# Altium footprint library RDM_ALT_PCB.PcbLib: 171 footprints (part 2 of 11)
Each footprint in its own frame and in the unit in brackets; x right, y up, seen from the top. Pads: shape width x height; smd on the part's side, far side on the other; paste and mask are expansions set on the pad; w line width, h text height; cw(c..) or ccw(c..) is an arc to the next point about the centre after c.
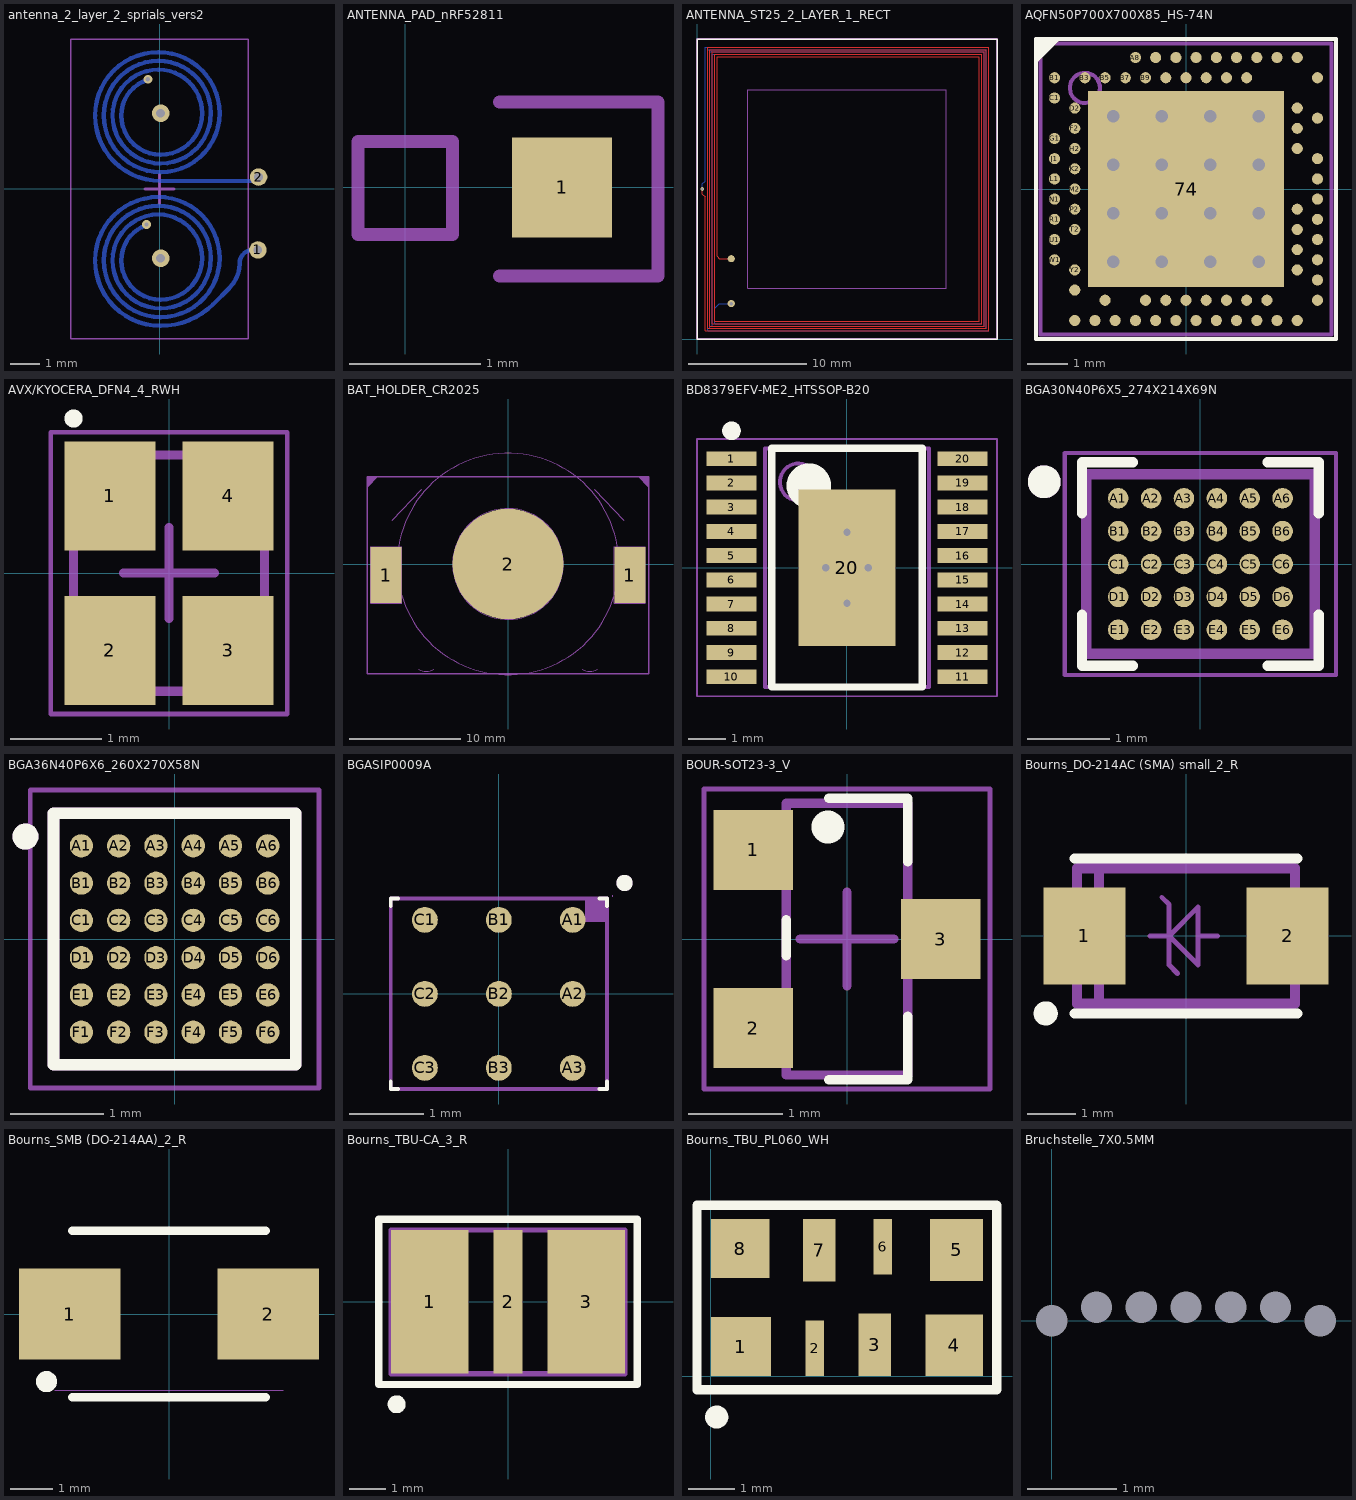
[diagram p1: the footprints below, top view; thin cyan lines are the x and y axes]

## antenna_2_layer_2_sprials_vers2 [mm] "antenna 2 layer"
pads (2):
  round 0.6 hole 0.3: 1(3.377,-2.093) 2(3.402,0.411)
via -0.399,3.772 diameter 0.3 hole 0.15
via -0.445,-1.22 diameter 0.3 hole 0.15
via 0.037,-2.376 diameter 0.6 hole 0.3
via 0.037,2.601 diameter 0.6 hole 0.3
Mid-Layer 1:
  lines w0.15: 0.037,-2.376 0.037,2.601
Mid-Layer 2:
  lines w0.15: -0.436,-1.244 cw(c-0.038,-2.376) 1.162,-2.376 cw(c0.037,-2.376) 0.037,-3.501 cw(c0.037,-2.451) -1.012,-2.451 cw(c-0.038,-2.451) -0.038,-1.476 cw(c-0.038,-2.376) 0.862,-2.376 cw(c0.037,-2.376) 0.037,-3.201 cw(c0.037,-2.451) -0.713,-2.451 cw(c-0.038,-2.451) -0.038,-1.776 cw(c-0.038,-2.376) 0.562,-2.376 cw(c0.037,-2.376) 0.037,-2.901 cw(c0.037,-2.638) 0.037,-2.376 ; -0.392,3.747 cw(c-0.038,2.601) 1.162,2.601 cw(c0.037,2.601) 0.037,1.476 cw(c0.037,2.526) -1.012,2.526 cw(c-0.038,2.526) -0.038,3.501 cw(c-0.038,2.601) 0.862,2.601 cw(c0.037,2.601) 0.037,1.776 cw(c0.037,2.526) -0.713,2.526 cw(c-0.038,2.526) -0.038,3.201 cw(c-0.038,2.601) 0.562,2.601 cw(c0.037,2.601) 0.037,2.076 cw(c0.037,2.338) 0.037,2.601
Bottom Layer:
  lines w0.15: -0.438,-1.24 ccw(c-0.038,-2.451) -1.313,-2.451 ccw(c0.037,-2.451) 0.037,-3.801 ccw(c0.037,-2.376) 1.462,-2.376 ccw(c-0.038,-2.376) -0.038,-0.876 ccw(c-0.038,-2.451) -1.613,-2.451 ccw(c0.037,-2.451) 0.037,-4.101 ccw(c0.037,-2.376) 1.762,-2.376 ccw(c-0.038,-2.376) -0.038,-0.576 ccw(c-0.038,-2.451) -1.913,-2.451 ccw(c0.037,-2.451) 0.037,-4.401 ccw(c0.037,-2.376) 2.062,-2.376 ccw(c-0.038,-2.376) -0.038,-0.276 ccw(c-0.038,-2.451) -2.212,-2.451 ccw(c0.037,-2.451) 0.037,-4.701 ccw(c0.037,-2.137) 1.85,-3.95 2.396,-3.404 ccw(c1.543,-2.55) 2.75,-2.55 cw(c3.207,-2.55) 3.101,-2.105 ; -0.393,3.75 ccw(c-0.038,2.526) -1.313,2.526 ccw(c0.037,2.526) 0.037,1.176 ccw(c0.037,2.601) 1.462,2.601 ccw(c-0.038,2.601) -0.038,4.101 ccw(c-0.038,2.526) -1.613,2.526 ccw(c0.037,2.526) 0.037,0.876 ccw(c0.037,2.601) 1.762,2.601 ccw(c-0.038,2.601) -0.038,4.401 ccw(c-0.038,2.526) -1.913,2.526 ccw(c0.037,2.526) 0.037,0.576 ccw(c0.037,2.601) 2.062,2.601 ccw(c-0.038,2.601) -0.038,4.701 ccw(c-0.038,2.526) -2.212,2.526 ccw(c0.037,2.526) 0.037,0.276 3.2,0.276
Mechanical 15:
  lines w0.013: -0.188,2.601 0.037,2.601
  lines w0.05: -3.05,-5.15 -3.05,5.15 3.05,5.15 3.05,-5.15 -3.05,-5.15
  lines w0.1: -0.5,0 0.5,0 ; 0,-0.5 0,0.5
3D body: height 0.25, standoff 0, extent 3.742,1.578 3.742,1.578

## ANTENNA_PAD_nRF52811 [mil] "open end one wire antenna for 2.4GHz"
pads (1):
  rect 30x30 smd: 1(47.05,0)
Mechanical 15:
  lines w3.94: 28.35,-26.57 75.79,-26.57 75.79,25.59 28.35,25.59 ; -14.17,-14.17 14.17,-14.17 14.17,13.78 -14.17,13.78 -14.17,-14.17

## ANTENNA_ST25_2_LAYER_1_RECT [mm] "3,56 MHZ NFC Antenna for Nordic ST25DV04K"
pads (2):
  round 0.6 smd: 1(2.9,6.8) 2(2.9,3)
via 2.9,3 diameter 0.6 hole 0.3
via 0.457,12.7 diameter 0.3 hole 0.2
Top Layer:
  lines w0.1: 0.457,12.7 0.457,12.268 0.698,12.027 0.698,0.7 24.7,0.7 24.7,24.7 0.9,24.7 0.9,0.9 24.5,0.9 24.5,24.5 1.1,24.5 1.1,1.1 24.3,1.1 24.3,24.3 1.3,24.3 1.3,1.3 24.1,1.3 24.1,24.1 1.5,24.1 1.5,1.5 23.9,1.5 23.9,23.9 1.7,23.9 1.7,7 1.9,6.8 2.9,6.8
Bottom Layer:
  lines w0.1: 0.457,12.7 0.457,13.132 0.7,13.375 0.702,24.7 24.7,24.7 24.7,0.7 0.9,0.7 0.9,24.5 24.5,24.5 24.5,0.9 1.1,0.9 1.1,24.3 24.3,24.3 24.3,1.1 1.3,1.1 1.3,24.1 24.1,24.1 24.1,1.3 1.5,1.3 1.5,2.6 1.9,3 2.9,3
Top Overlay:
  lines w0.127: 0,0 0,25.4 25.4,25.4 25.4,0 0,0
Mechanical 15:
  lines w0.1: 0,0 25.4,0 ; 4.3,4.3 4.3,21.1 21.1,21.1 21.1,4.3 4.3,4.3
  lines w0.15: 0,0 0,25.4 25.4,25.4 25.4,0 0,0

## AQFN50P700X700X85_HS-74N [mm] "nRF52840"
pads (74):
  rect 4.85x4.85 smd mask+0.05: 74(0,0)
  round 0.275 smd paste+0.012 mask+0.05: A8(-1.25,3.25) A10(-0.75,3.25) A12(-0.25,3.25) A14(0.25,3.25) A16(0.75,3.25) A18(1.25,3.25) A20(1.75,3.25) A22(2.25,3.25) A23(2.75,3.25) AA24(3.25,-2.25) AB2(-2.75,-2.5) AC5(-2,-2.75) AC9(-1,-2.75) AC11(-0.5,-2.75) AC13(0,-2.75) AC15(0.5,-2.75) AC17(1,-2.75) AC19(1.5,-2.75) AC21(2,-2.75) AC24(3.25,-2.75) AD2(-2.75,-3.25) AD4(-2.25,-3.25) AD6(-1.75,-3.25) AD8(-1.25,-3.25) AD10(-0.75,-3.25) AD12(-0.25,-3.25) AD14(0.25,-3.25) AD16(0.75,-3.25) AD18(1.25,-3.25) AD20(1.75,-3.25) AD22(2.25,-3.25) AD23(2.75,-3.25) B1(-3.25,2.75) B3(-2.5,2.75) B5(-2,2.75) B7(-1.5,2.75) B9(-1,2.75) B11(-0.5,2.75) B13(0,2.75) B15(0.5,2.75) B17(1,2.75) B19(1.5,2.75) B24(3.25,2.75) C1(-3.25,2.25) D2(-2.75,2) D23(2.75,2) E24(3.25,1.75) F2(-2.75,1.5) F23(2.75,1.5) G1(-3.25,1.25) H2(-2.75,1) H23(2.75,1) J1(-3.25,0.75) J24(3.25,0.75) K2(-2.75,0.5) L1(-3.25,0.25) L24(3.25,0.25) M2(-2.75,0) N1(-3.25,-0.25) N24(3.25,-0.25) P2(-2.75,-0.5) P23(2.75,-0.5) R1(-3.25,-0.75) R24(3.25,-0.75) T2(-2.75,-1) T23(2.75,-1) U1(-3.25,-1.25) U24(3.25,-1.25) V23(2.75,-1.5) W1(-3.25,-1.75) W24(3.25,-1.75) Y2(-2.75,-2) Y23(2.75,-2)
via 1.8,-1.8 diameter 0.61 hole 0.305
via 0.6,-1.8 diameter 0.61 hole 0.305
via -0.6,-1.8 diameter 0.61 hole 0.305
via -1.8,-1.8 diameter 0.61 hole 0.305
via 1.8,-0.6 diameter 0.61 hole 0.305
via 0.6,-0.6 diameter 0.61 hole 0.305
via -0.6,-0.6 diameter 0.61 hole 0.305
via -1.8,-0.6 diameter 0.61 hole 0.305
via 1.8,0.6 diameter 0.61 hole 0.305
via 0.6,0.6 diameter 0.61 hole 0.305
via -0.6,0.6 diameter 0.61 hole 0.305
via -1.8,0.6 diameter 0.61 hole 0.305
via 1.8,1.8 diameter 0.61 hole 0.305
via 0.6,1.8 diameter 0.61 hole 0.305
via -0.6,1.8 diameter 0.61 hole 0.305
via -1.8,1.8 diameter 0.61 hole 0.305
Top Overlay:
  region: -3.154,3.654 -3.654,3.154 -3.654,3.654
  lines w0.1: -3.708,-3.708 3.708,-3.708 3.708,3.708 -3.708,3.708 -3.708,-3.708
Mechanical 13:
  region: -3.154,3.654 -3.654,3.154 -3.654,3.654
  lines w0.05: -0.3,0 0.3,0 ; 0,-0.3 0,0.3
  lines w0.1: -3.6,-3.6 -3.6,3.6 3.6,3.6 3.6,-3.6 -3.6,-3.6
Mechanical 15:
  circle w0.1: c-2.5,2.5 r0.373
  region: -3.154,3.654 -3.654,3.154 -3.654,3.654
  lines w0.05: -0.3,0 0.3,0 ; 0,-0.3 0,0.3
  lines w0.1: -3.708,-3.708 -3.708,3.708 3.708,3.708 3.708,-3.708 -3.708,-3.708
  text ".Designator" at -0.178,-0.152 h0.3
3D body "LGA88C25P25X25_700X700X85.step": height 0.85, standoff 0, extent -3.55,-3.55 3.55,3.55

## AVX/KYOCERA_DFN4_4_RWH [mm]
pads (4):
  rect 1x1.2 smd: 1(-0.65,0.85) 2(-0.65,-0.85) 3(0.65,-0.85) 4(0.65,0.85)
Top Overlay:
  circle w0.1: c-1.05,1.7 r0.05
Mechanical 13:
  lines w0.1: -1.05,-1.3 1.05,-1.3 1.05,1.3 -1.05,1.3 -1.05,-1.3
Mechanical 15:
  lines w0.05: -1.3,-1.55 1.3,-1.55 1.3,1.55 -1.3,1.55 -1.3,-1.55
  lines w0.1: -0.5,0 0.5,0 ; 0,-0.5 0,0.5
3D body "DFN130P200X55-4N.step": height 0.55, standoff 0, extent -1.05,-1.45 1.5,1.45

## BAT_HOLDER_CR2025 [mm] "BATTERY RETAINER COIN 20MM SMD"
pads (3):
  rect 2.79x5.08 smd: 1(-11,-1) 1(11,-1)
  round 10 smd: 2(0,0)
Mechanical 29 (Mech29):
  circle w0.1: c0,0 r5.004
  circle w0.1: c0,0 r10
  region: -12.7,7.25
  region: -12.7,6.9 -11.7,7.9 -12.7,7.9
  region: 11.7,7.9 12.7,6.9 12.7,7.9
  lines w0.1: -12.395,-3.53 -12.383,-3.542 -9.615,-3.542 -9.604,-3.531 -9.604,1.544 -9.609,1.539 -12.395,1.539 -12.395,-3.529 ; -10.439,3.937 -7.798,6.731 ; -8.049,-9.496 ccw(c-7.38,-8.497) -6.709,-9.494 ; -1.06,-1.063 1.06,1.059 ; -1.06,1.058 1.061,-1.063 ; 6.711,-9.496 ccw(c7.38,-8.497) 8.051,-9.494 ; 7.798,6.756 10.465,3.937 ; 9.6,-3.524 9.612,-3.536 12.38,-3.536 12.391,-3.525 12.391,1.55 12.386,1.545 9.6,1.545 9.6,-3.523
  lines w0.127: -12.7,-9.89 -12.7,7.89 ; -12.7,-9.89 -12.7,7.89 ; -12.7,-9.89 12.7,-9.89 ; -12.7,-9.89 12.7,-9.89 ; -12.7,7.89 12.7,7.89 ; -12.7,7.89 12.7,7.89 ; 12.7,-9.89 12.7,7.89 ; 12.7,-9.89 12.7,7.89
3D body: height 2.45, standoff 0, extent -10,-10 10,10
3D body "User Library-keystone-PN3034.STEP": height 4.08, standoff 0.01, extent -11.621,-9.725 11.621,6.754

## BD8379EFV-ME2_HTSSOP-B20 [mm] "TSOP, 20-Leads, Body 6.40x4.40mm, Pitch 0.65mm, IPC Medium Density"
height 1.5
pads (21):
  rect 1.35x0.4 smd: 1(-3.1,2.925) 2(-3.1,2.275) 3(-3.1,1.625) 4(-3.1,0.975) 5(-3.1,0.325) 6(-3.1,-0.325) 7(-3.1,-0.975) 8(-3.1,-1.625) 9(-3.1,-2.275) 10(-3.1,-2.925) 11(3.1,-2.925) 12(3.1,-2.275) 13(3.1,-1.625) 14(3.1,-0.975) 15(3.1,-0.325) 16(3.1,0.325) 17(3.1,0.975) 18(3.1,1.625) 19(3.1,2.275) 20(3.1,2.925)
  rect 2.6x4.2 smd: 20(0,0)
via 0.575,0 diameter 0.3 hole 0.2
via 0,0.95 diameter 0.3 hole 0.2
via 0,-0.95 diameter 0.3 hole 0.2
via -0.575,0 diameter 0.3 hole 0.2
Top Overlay:
  circle w0.6: c-1.025,2.2 r0.3
  circle w0.25: c-3.1,3.675 r0.125
  lines w0.2: -2.025,-3.2 2.025,-3.2 2.025,3.2 -2.025,3.2 -2.025,-3.2
Mechanical 13:
  circle w0.1: c-1.3,2.3 r0.5
  lines w0.1: -2.2,-3.2 2.2,-3.2 2.2,3.2 -2.2,3.2 -2.2,-3.2
Mechanical 15:
  lines w0.05: -4.025,-3.45 4.025,-3.45 4.025,3.45 -4.025,3.45 -4.025,-3.45
  lines w0.1: -0.5,0 0.5,0 ; 0,-0.5 0,0.5
3D body: height 1, standoff 0.1, extent -2.2,-3.2 2.2,3.2

## BGA30N40P6X5_274X214X69N [mm] "ST25R3912"
pads (30):
  round 0.25 smd: A1(-1,0.8) A2(-0.6,0.8) A3(-0.2,0.8) A4(0.2,0.8) A5(0.6,0.8) A6(1,0.8) B1(-1,0.4) B2(-0.6,0.4) B3(-0.2,0.4) B4(0.2,0.4) B5(0.6,0.4) B6(1,0.4) C1(-1,0) C2(-0.6,0) C3(-0.2,0) C4(0.2,0) C5(0.6,0) C6(1,0) D1(-1,-0.4) D2(-0.6,-0.4) D3(-0.2,-0.4) D4(0.2,-0.4) D5(0.6,-0.4) D6(1,-0.4) E1(-1,-0.8) E2(-0.6,-0.8) E3(-0.2,-0.8) E4(0.2,-0.8) E5(0.6,-0.8) E6(1,-0.8)
Top Overlay:
  circle w0.2: c-1.9,1 r0.1
  lines w0.127: -1.44,-0.62 -1.44,-1.24 -0.82,-1.24 ; -1.44,0.62 -1.44,1.24 -0.82,1.24 ; 0.82,-1.24 1.44,-1.24 1.44,-0.62 ; 0.82,1.24 1.44,1.24 1.44,0.62
Mechanical 4:
  circle w0.2: c-1.9,1 r0.1
  circle w0.2: c-1.9,1 r0.1
  lines w0.127: -1.39,-1.09 1.39,-1.09 ; -1.39,-1.09 -1.39,1.09 ; -1.39,-1.09 1.39,-1.09 ; -1.39,-1.09 -1.39,1.09 ; -1.39,1.09 1.39,1.09 ; -1.39,1.09 1.39,1.09 ; 1.39,-1.09 1.39,1.09 ; 1.39,-1.09 1.39,1.09
Mechanical 16:
  lines w0.05: -1.65,-1.35 1.65,-1.35 1.65,1.35 -1.65,1.35 -1.65,-1.35

## BGA36N40P6X6_260X270X58N [mm] "MCU 32-Bit STM32 ARM Cortex M4 RISC 128KB Flash 2.5V/3.3V 36-Pin WLCSP"
pads (36):
  round 0.25 smd: A1(-1,1) A2(-0.6,1) A3(-0.2,1) A4(0.2,1) A5(0.6,1) A6(1,1) B1(-1,0.6) B2(-0.6,0.6) B3(-0.2,0.6) B4(0.2,0.6) B5(0.6,0.6) B6(1,0.6) C1(-1,0.2) C2(-0.6,0.2) C3(-0.2,0.2) C4(0.2,0.2) C5(0.6,0.2) C6(1,0.2) D1(-1,-0.2) D2(-0.6,-0.2) D3(-0.2,-0.2) D4(0.2,-0.2) D5(0.6,-0.2) D6(1,-0.2) E1(-1,-0.6) E2(-0.6,-0.6) E3(-0.2,-0.6) E4(0.2,-0.6) E5(0.6,-0.6) E6(1,-0.6) F1(-1,-1) F2(-0.6,-1) F3(-0.2,-1) F4(0.2,-1) F5(0.6,-1) F6(1,-1)
Top Overlay:
  circle w0.14: c-1.6,1.1 r0.07
  lines w0.127: -1.3,-1.35 1.3,-1.35 1.3,1.35 -1.3,1.35 -1.3,-1.35
Top Solder:
  circle w0: c-1,1 r0.175
  circle w0: c-0.6,1 r0.175
  circle w0: c-0.2,1 r0.175
  circle w0: c0.2,1 r0.175
  circle w0: c0.6,1 r0.175
  circle w0: c1,1 r0.175
  circle w0: c-1,0.6 r0.175
  circle w0: c-0.6,0.6 r0.175
  circle w0: c-0.2,0.6 r0.175
  circle w0: c0.2,0.6 r0.175
  circle w0: c0.6,0.6 r0.175
  circle w0: c1,0.6 r0.175
  circle w0: c-1,0.2 r0.175
  circle w0: c-0.6,0.2 r0.175
  circle w0: c-0.2,0.2 r0.175
  circle w0: c0.2,0.2 r0.175
  circle w0: c0.6,0.2 r0.175
  circle w0: c1,0.2 r0.175
  circle w0: c-1,-0.2 r0.175
  circle w0: c-0.6,-0.2 r0.175
  circle w0: c-0.2,-0.2 r0.175
  circle w0: c0.2,-0.2 r0.175
  circle w0: c0.6,-0.2 r0.175
  circle w0: c1,-0.2 r0.175
  circle w0: c-1,-0.6 r0.175
  circle w0: c-0.6,-0.6 r0.175
  circle w0: c-0.2,-0.6 r0.175
  circle w0: c0.2,-0.6 r0.175
  circle w0: c0.6,-0.6 r0.175
  circle w0: c1,-0.6 r0.175
  circle w0: c-1,-1 r0.175
  circle w0: c-0.6,-1 r0.175
  circle w0: c-0.2,-1 r0.175
  circle w0: c0.2,-1 r0.175
  circle w0: c0.6,-1 r0.175
  circle w0: c1,-1 r0.175
Mechanical 4:
  circle w0.14: c-1.6,1.1 r0.07
  circle w0.14: c-1.6,1.1 r0.07
  lines w0.127: -1.3,-1.35 -1.3,1.35 ; -1.3,-1.35 1.3,-1.35 ; -1.3,-1.35 -1.3,1.35 ; -1.3,-1.35 1.3,-1.35 ; -1.3,1.35 1.3,1.35 ; -1.3,1.35 1.3,1.35 ; 1.3,-1.35 1.3,1.35 ; 1.3,-1.35 1.3,1.35
Mechanical 16:
  lines w0.05: -1.55,-1.6 1.55,-1.6 1.55,1.6 -1.55,1.6 -1.55,-1.6
3D body "STM32F051T8Y6TR--3DModel-STEP-56544.STEP": height 0.42, standoff -0.16, extent -1.303,-1.402 1.302,1.301

## BGASIP0009A [mm] "9 Pin µSIP-Package (TPS81256)"
pads (9):
  round 0.35 smd: A1(0.999,1) A2(0.999,0) A3(0.999,-1) B1(-0.001,1) B2(0,0) B3(-0.001,-1) C1(-1.001,1) C2(-1.001,0) C3(-1.001,-1)
Top Overlay:
  circle w0.2: c1.7,1.5 r0.01
  lines w0.05: -1.462,-1.185 -1.462,-1.287 -1.361,-1.287 ; -1.462,1.187 -1.462,1.288 -1.361,1.288 ; 1.361,-1.287 1.462,-1.287 1.462,-1.185 ; 1.361,1.288 1.462,1.288 1.462,1.187
Mechanical 4:
  circle w0.001: c1.537,1.324 r0.005
Mechanical 13:
  circle w0.2: c1.7,1.5 r0.01
  region: 1.463,1.273 1.168,1.273 1.168,0.969 1.463,0.969
  lines w0.03: -0.15,0 0.15,0 ; 0,-0.15 0,0.15
  lines w0.05: -1.462,-1.287 -1.462,1.288 1.462,1.288 1.462,-1.287 -1.462,-1.287
Mechanical 15:
  circle w0.2: c1.7,1.5 r0.01
  region: 1.463,1.273 1.168,1.273 1.168,0.969 1.463,0.969
  lines w0.03: -0.15,0 0.15,0 -0.15,0 ; 0,-0.15 0,0.15 0,-0.15
  lines w0.05: -1.462,-1.287 1.462,-1.287 1.462,1.288 -1.462,1.288 -1.462,-1.287
Multi-Layer:
  pour cut-out: 0.351,2.77
3D body: height 1, standoff -0.01, extent -1.473,-1.295 1.473,1.295

## BOUR-SOT23-3_V [mm] "SOT23, 3-Leads, Body 2.9x1.3mm, Pitch 0.95mm"
height 1.17
pads (3):
  rect 0.85x0.85 smd: 1(-1,0.95) 2(-1,-0.95) 3(1,0)
Top Overlay:
  circle w0.25: c-0.203,1.194 r0.051
  lines w0.102: -0.65,-0.178 -0.65,0.203 ; -0.195,-1.5 0.65,-1.5 0.65,-0.825 ; -0.195,1.5 0.65,1.5 0.65,0.825
Mechanical 13:
  lines w0.1: -0.65,-1.45 -0.65,1.45 0.65,1.45 0.65,-1.45 -0.65,-1.45
Mechanical 15:
  lines w0.05: -1.525,-1.6 -1.525,1.6 1.525,1.6 1.525,-1.6 -1.525,-1.6
  lines w0.1: -0.5,0 0.5,0 ; 0,-0.5 0,0.5
3D body: height 1.17, standoff 0.02, extent -0.65,-1.45 0.65,1.45

## Bourns_DO-214AC (SMA) small_2_R [mm] "Bourns_DO-214AC (SMA) small_2_R"
height 2.6
pads (2):
  rect 1.7x2 smd: 1(-2.1,0) 2(2.1,0)
Top Overlay:
  circle w0.25: c-2.9,-1.6 r0.125
  lines w0.21: -2.3,-1.6 2.3,-1.6 ; -2.3,1.6 2.3,1.6
Mechanical 13:
  lines w0.21: -1.8,-1.4 -1.8,1.4 ; -2.25,-1.4 -2.25,1.4 2.25,1.4 2.25,-1.4 -2.25,-1.4
Mechanical 15:
  lines w0.1: -0.75,0 -0.35,0 ; -0.5,0.8 -0.35,0.65 -0.35,0.6 -0.35,-0.6 -0.175,-0.775 ; 0.25,0 0.65,0 ; -0.35,0 0.25,0.6 0.25,-0.6 -0.35,0
3D body "DO-214AC SMA.step": height 2.4, standoff 0, extent -2.6,-1.3 2.6,1.3

## Bourns_SMB (DO-214AA)_2_R [mm] "Bourns_SMB (DO-214AA)_2_R"
height 2.4
pads (2):
  rect 2.4x2.16 smd: 1(-2.35,0) 2(2.35,0)
Top Overlay:
  circle w0.25: c-2.9,-1.6 r0.125
  lines w0.2: -2.285,-1.97 2.285,-1.97 ; -2.285,1.97 2.285,1.97
Mechanical 15:
  lines w0.01: -2.7,-1.81 2.7,-1.81
3D body "tisp4240m3bj.stp": height 2.13, standoff 0, extent -2.7,-1.81 2.7,1.81

## Bourns_TBU-CA_3_R [mm] "Bourns_TBU-CA_3_R"
height 1
pads (3):
  rect 2.15x4 smd: 1(-2.175,0) 3(2.175,0)
  rect 0.8x4 smd: 2(0,0)
Top Overlay:
  circle w0.25: c-3.1,-2.85 r0.125
  lines w0.2: -3.6,-2.3 -3.6,2.3 3.6,2.3 3.6,-2.3 -3.6,-2.3
Mechanical 13:
  lines w0.15: -3.25,-2 -3.25,2 3.25,2 3.25,-2 -3.25,-2
3D body: height 1, standoff 0, extent -3.25,-2 3.25,2

## Bourns_TBU_PL060_WH [mm] "TBU-PL060-200-WH"
height 1
pads (8):
  rect 1.3x1.275 smd: 1(0.65,0.637)
  rect 0.4x1.2 smd: 2(2.25,0.6) 6(3.725,2.8)
  rect 0.7x1.35 smd: 3(3.55,0.675) 7(2.35,2.725)
  rect 1.25x1.335 smd: 4(5.275,0.667)
  rect 1.15x1.335 smd: 5(5.325,2.732)
  rect 1.275x1.275 smd: 8(0.638,2.762)
Top Overlay:
  circle w0.25: c0.127,-0.889 r0.125
  lines w0.2: -0.301,-0.298 6.195,-0.298 ; -0.3,-0.3 -0.3,3.7 6.195,3.7 6.195,-0.294
Mechanical 13:
  lines w0.15: -0.3,-0.3 6.2,-0.3 6.2,3.703 -0.297,3.703 ; -0.3,-0.297 -0.3,3.703
Multi-Layer:
  region: 3.774,-0.042
3D body: height 1, standoff 0, extent -0.302,-0.315 6.203,3.665

## Bruchstelle_7X0.5MM [mm] "Bruchstelle_7X0.5MM"
pads (7):
  round 0 hole 0.35 unplated paste+0 mask+0.102: 0(0,0) 0(0.5,0.15) 0(1,0.15) 0(1.5,0.15) 0(2,0.15) 0(2.5,0.15) 0(3,0)